# Altium footprint library JL_PCB.PCBLIB: 1112 footprints (part 61 of 71)
Each footprint in its own frame and in the unit in brackets; x right, y up, seen from the top. Pads: shape width x height; smd on the part's side, far side on the other; paste and mask are expansions set on the pad; w line width, h text height; cw(c..) or ccw(c..) is an arc to the next point about the centre after c.
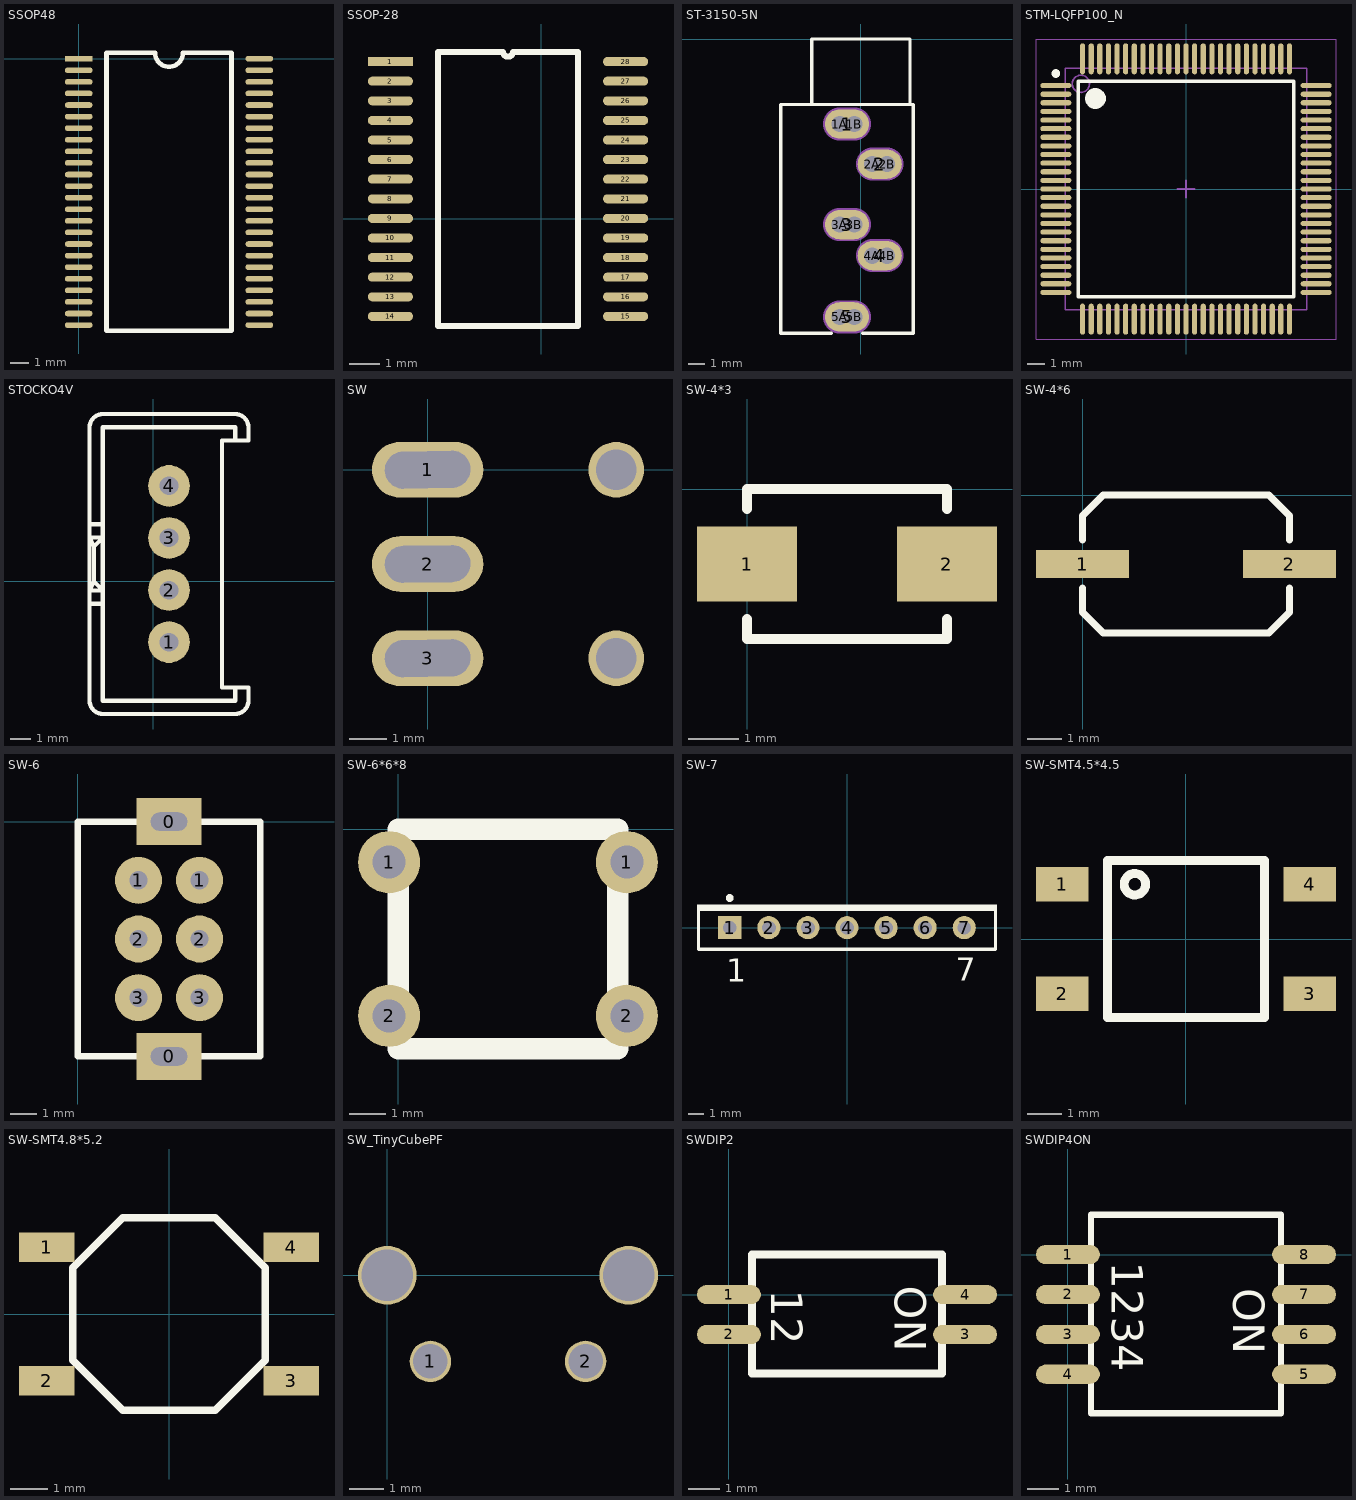
[diagram p60: the footprints below, top view; thin cyan lines are the x and y axes]

## SSOP48 [mil]
pads (48):
  rect 60x12 smd: 1(0,0)
  oval 60x12 smd: 2(0,-25) 3(0,-50) 4(0,-75) 5(0,-100) 6(0,-125) 7(0,-150) 8(0,-175) 9(0,-200) 10(0,-225) 11(0,-250) 12(0,-275) 13(0,-300) 14(0,-325) 15(0,-350) 16(0,-375) 17(0,-400) 18(0,-425) 19(0,-450) 20(0,-475) 21(0,-500) 22(0,-525) 23(0,-550) 24(0,-575) 25(390,-575) 26(390,-550) 27(390,-525) 28(390,-500) 29(390,-475) 30(390,-450) 31(390,-425) 32(390,-400) 33(390,-375) 34(390,-350) 35(390,-325) 36(390,-300) 37(390,-275) 38(390,-250) 39(390,-225) 40(390,-200) 41(390,-175) 42(390,-150) 43(390,-125) 44(390,-100) 45(390,-75) 46(390,-50) 47(390,-25) 48(390,0)
TopOverlay:
  lines w10: 60,-587.5 330,-587.5 330,12.5 225,12.5 cw(c195,12.5) 165,12.5 60,12.5 60,-587.5

## SSOP-28 [mm]
pads (28):
  rect 1.5x0.3 smd: 1(-4.996,5.219)
  oval 1.5x0.3 smd: 2(-4.996,4.569) 3(-4.996,3.919) 4(-4.996,3.269) 5(-4.996,2.619) 6(-4.996,1.969) 7(-4.996,1.319) 8(-4.996,0.669) 9(-4.996,0.019) 10(-4.996,-0.631) 11(-4.996,-1.281) 12(-4.996,-1.931) 13(-4.996,-2.581) 14(-4.996,-3.231) 15(2.804,-3.231) 16(2.804,-2.581) 17(2.804,-1.931) 18(2.804,-1.281) 19(2.804,-0.631) 20(2.804,0.019) 21(2.804,0.669) 22(2.804,1.319) 23(2.804,1.969) 24(2.804,2.619) 25(2.804,3.269) 26(2.804,3.919) 27(2.804,4.569) 28(2.804,5.219)
TopOverlay:
  lines w0.2: -3.411,-3.556 -3.411,5.544 -1.259,5.544 ccw(c-1.096,5.544) -0.934,5.544 1.219,5.544 1.219,-3.556 -3.411,-3.556

## ST-3150-5N [mm] "Connector; Stereo Jack, 3.5mm, 5 Position"
pads (15):
  oval 2.7x1.8 all layers, no hole: 1(-0.85,-5.2) 2(1.15,-7.65) 3(-0.85,-11.35) 4(1.15,-13.25) 5(-0.85,-17)
  round 1.2 hole 1: 1A(-1.3,-5.2) 1B(-0.4,-5.2) 2A(0.7,-7.65) 2B(1.6,-7.65) 3A(-1.3,-11.35) 3B(-0.4,-11.35) 4A(0.7,-13.25) 4B(1.6,-13.25) 5A(-1.3,-17) 5B(-0.4,-17)
TopOverlay:
  lines w0.2: -3,-4 -3,0 3,0 3,-4 ; -1.8,-18 -4.9,-18 -4.9,-4 3.2,-4 3.2,-18 0.1,-18
Mechanical1:
  lines w1: -1.3,-17 -0.4,-17 ; -1.3,-11.35 -0.4,-11.35 ; -1.3,-5.2 -0.4,-5.2 ; 0.7,-13.25 1.6,-13.25 ; 0.7,-7.65 1.6,-7.65
  text "Mech 2 - Clearance, move to internal plane if present" at -7.226,0.374 h0.3
  text "Mech 1 - Slot cut-out" at -7.226,0.874 h0.3
  text "Assign keep-out area to slot" at -7.226,2.374 h0.3
  text "Slot 1x1.9mm, PTH" at -7.226,1.374 h0.3
  text "Alert PCB fab to slot details" at -7.226,1.874 h0.3
Mechanical2:
  lines w2.016: -1.3,-17 -0.4,-17 ; -1.3,-11.35 -0.4,-11.35 ; -1.3,-5.2 -0.4,-5.2 ; 0.7,-13.25 1.6,-13.25 ; 0.7,-7.65 1.6,-7.65

## STM-LQFP100_N [mm] "Thin QFP, 100-Leads, Body 14x14mm, Pitch 0.5mm, IPC Medium Density"
height 1.6
pads (100):
  oval 1.8x0.3 smd: 1(-7.55,6) 2(-7.55,5.5) 3(-7.55,5) 4(-7.55,4.5) 5(-7.55,4) 6(-7.55,3.5) 7(-7.55,3) 8(-7.55,2.5) 9(-7.55,2) 10(-7.55,1.5) 11(-7.55,1) 12(-7.55,0.5) 13(-7.55,0) 14(-7.55,-0.5) 15(-7.55,-1) 16(-7.55,-1.5) 17(-7.55,-2) 18(-7.55,-2.5) 19(-7.55,-3) 20(-7.55,-3.5) 21(-7.55,-4) 22(-7.55,-4.5) 23(-7.55,-5) 24(-7.55,-5.5) 25(-7.55,-6) 51(7.55,-6) 52(7.55,-5.5) 53(7.55,-5) 54(7.55,-4.5) 55(7.55,-4) 56(7.55,-3.5) 57(7.55,-3) 58(7.55,-2.5) 59(7.55,-2) 60(7.55,-1.5) 61(7.55,-1) 62(7.55,-0.5) 63(7.55,0) 64(7.55,0.5) 65(7.55,1) 66(7.55,1.5) 67(7.55,2) 68(7.55,2.5) 69(7.55,3) 70(7.55,3.5) 71(7.55,4) 72(7.55,4.5) 73(7.55,5) 74(7.55,5.5) 75(7.55,6)
  oval 0.3x1.8 smd: 26(-6,-7.55) 27(-5.5,-7.55) 28(-5,-7.55) 29(-4.5,-7.55) 30(-4,-7.55) 31(-3.5,-7.55) 32(-3,-7.55) 33(-2.5,-7.55) 34(-2,-7.55) 35(-1.5,-7.55) 36(-1,-7.55) 37(-0.5,-7.55) 38(0,-7.55) 39(0.5,-7.55) 40(1,-7.55) 41(1.5,-7.55) 42(2,-7.55) 43(2.5,-7.55) 44(3,-7.55) 45(3.5,-7.55) 46(4,-7.55) 47(4.5,-7.55) 48(5,-7.55) 49(5.5,-7.55) 50(6,-7.55) 76(6,7.55) 77(5.5,7.55) 78(5,7.55) 79(4.5,7.55) 80(4,7.55) 81(3.5,7.55) 82(3,7.55) 83(2.5,7.55) 84(2,7.55) 85(1.5,7.55) 86(1,7.55) 87(0.5,7.55) 88(0,7.55) 89(-0.5,7.55) 90(-1,7.55) 91(-1.5,7.55) 92(-2,7.55) 93(-2.5,7.55) 94(-3,7.55) 95(-3.5,7.55) 96(-4,7.55) 97(-4.5,7.55) 98(-5,7.55) 99(-5.5,7.55) 100(-6,7.55)
TopOverlay:
  circle w0.25: c-7.55,6.7 r0.125
  circle w0.6: c-5.25,5.25 r0.3
  lines w0.2: -6.25,-6.25 -6.25,6.25 6.25,6.25 6.25,-6.25 -6.25,-6.25
Mechanical13:
  circle w0.1: c-6.1,6.1 r0.5
  lines w0.1: -7,-7 -7,7 7,7 7,-7 -7,-7
Mechanical15:
  lines w0.05: -8.7,-8.7 -8.7,8.7 8.7,8.7 8.7,-8.7 -8.7,-8.7
  lines w0.1: -0.5,0 0.5,0 ; 0,-0.5 0,0.5
3D body: height 1.6, standoff 0.05, extent -7,-7 7,7

## STOCKO4V [mil]
pads (4):
  round 78.74 hole 35: 1(30,-115) 2(30,-16.67) 3(30,81.67) 4(30,180)
TopOverlay:
  lines w7.87: -120,-225.83 -120,290.83 ; -120,-42.5 -95,-42.5 ; -120,107.5 -95,107.5 ; -95,-250.83 155,-250.83 ; -95,315.83 155,315.83 ; 155,-200.83 155,-225.83 -95,-225.83 -95,290.83 155,290.83 155,265.83 ; 180,-225.83 180,-200.83 130,-200.83 130,265.83 180,265.83 180,290.83 ; -111.67,-0.83 -120,-17.5 -95,-17.5 -111.67,-0.83 ; -111.67,-0.83 -111.67,65.83 ; -111.67,65.83 -120,82.5 -95,82.5 -111.67,65.83
  lines w8: -120,-225.83 ccw(c-95,-225.83) -95,-250.83 ; -120,290.83 cw(c-95,290.83) -95,315.83 ; 155,-250.83 ccw(c155,-225.83) 180,-225.83 ; 155,315.83 cw(c155,290.83) 180,290.83

## SW [mm]
pads (5):
  oval 3x1.5 hole 1 slot 2.3 at 1 deg: 1(0,0) 2(0,-2.54) 3(0,-5.08)
  round 1.5 hole 1.1 unplated: ""(5.08,-5.08) ""(5.08,0)

## SW-4*3 [mm] "SWITCH"
height 4
pads (2):
  rect 2x1.5 smd: 1(0,-1.5) 2(4,-1.5)
TopOverlay:
  lines w0.203: 0,-2.6 0,-3 4,-3 4,-2.6 ; 0,-0.4 0,0 4,0 4,-0.4

## SW-4*6 [mm] "SWITCH"
height 4
pads (2):
  rect 2.7x0.8 smd: 1(0,-2) 2(6,-2)
TopOverlay:
  lines w0.203: 0,-2.7 0,-3.4 0.6,-4 5.4,-4 6,-3.4 ; 0,-1.3 0,-0.6 0.6,0 5.4,0 ; 6,-2.7 6,-3.4 ; 6,-1.3 6,-0.6 5.4,0 ; 5.4,0 5.4,0 ; 5.4,0 5.4,0 ; 6,-3.4 6,-3.4

## SW-6 [mm]
pads (8):
  rect 2.5x1.8 hole 0.7 slot 1.4 at 0 deg: 0(3.5,-9) 0(3.5,0)
  round 1.8 hole 0.7: 1(2.33,-2.25) 1(4.67,-2.25) 2(2.33,-4.5) 2(4.67,-4.5) 3(2.33,-6.75) 3(4.67,-6.75)
TopOverlay:
  lines w0.254: 0,-9 0,0 7,0 7,-9 0,-9
3D body "SW-6.STEP": height 4.42, standoff -3.98, extent -3.631,-9.71 6.569,0.79

## SW-6*6*8 [mm]
pads (4):
  round 1.7 hole 0.9: 1(-0.25,-0.9) 1(6.25,-0.9) 2(-0.25,-5.1) 2(6.25,-5.1)
TopOverlay:
  lines w0.6: 0,-6 6,-6 6,0 0,0 0,-6
3D body "DTS-6 6_6.STEP": height 7.4, standoff -3.5, extent -0.978,-6.097 6.922,0.103

## SW-7 [mm] "6 Way Switch; 7 Leads"
pads (7):
  rect 1.5x1.5 hole 0.9: 1(-7.62,0)
  round 1.5 hole 0.9: 2(-5.08,0) 3(-2.54,0) 4(0,0) 5(2.54,0) 6(5.08,0) 7(7.62,0)
TopOverlay:
  circle w0.25: c-7.625,1.929 r0.125
  rectangle: -9.75,1.1 9.75,1.5
  lines w0.2: -9.65,1.4 -9.65,-1.4 9.65,-1.4 9.65,1.4
  text "1" at -7.851,-3.526 h1.5
  text "7" at 7.084,-3.445 h1.5

## SW-SMT4.5*4.5 [mm]
pads (4):
  rect 1.5x1 smd: 1(-3.55,1.57) 2(-3.55,-1.57) 3(3.55,-1.57) 4(3.55,1.57)
TopOverlay:
  circle w0.254: c-1.465,1.57 r0.307
  lines w0.254: -2.25,-2.25 2.25,-2.25 2.25,2.25 -2.25,2.25 -2.25,-2.25
3D body "PUSH BUTTON-3.STEP": height 7.49, standoff 0.02, extent -4.066,-2.235 3.934,2.265

## SW-SMT4.8*5.2 [mm]
pads (4):
  rect 1.5x0.8 smd: 1(-3.3,1.8) 2(-3.3,-1.8) 3(3.3,-1.8) 4(3.3,1.8)
TopOverlay:
  lines w0.203: -2.6,1.254 -1.254,2.6 ; -2.6,-1.25 -1.25,-2.6 1.25,-2.6 2.6,-1.25 2.6,1.25 1.25,2.6 -1.25,2.6 -2.6,1.25 -2.6,-1.25

## SW_TinyCubePF [mm]
pads (4):
  round 1.2 hole 1 unplated: 1(1.25,-2.5) 2(5.75,-2.5)
  round 1.7 hole 1.5 unplated: ""(0,0) ""(7,0)

## SWDIP2 [mil]
pads (4):
  oval 80x24 smd: 1(0,0) 2(0,-50) 3(296,-50) 4(296,0)
TopOverlay:
  lines w10: 29,-99 267,-99 267,50 29,50 29,-99
  text "ON" at 208,11 h39.37
  text "12" at 53,6 h39.37

## SWDIP4ON [mil]
pads (8):
  oval 80x24 smd: 1(0,0) 2(0,-50) 3(0,-100) 4(0,-150) 5(296,-150) 6(296,-100) 7(296,-50) 8(296,0)
TopOverlay:
  lines w7.87: 29,-199 29,50 267,50 267,-199 29,-199
  text "ON" at 207,-42 h39.37
  text "1234" at 55,-9 h39.37